# Altium footprint library 7-Connectors-8.PcbLib: 18 footprints (part 2 of 2)
Each footprint in its own frame and in the unit in brackets; x right, y up, seen from the top. Pads: shape width x height; smd on the part's side, far side on the other; paste and mask are expansions set on the pad; w line width, h text height; cw(c..) or ccw(c..) is an arc to the next point about the centre after c.
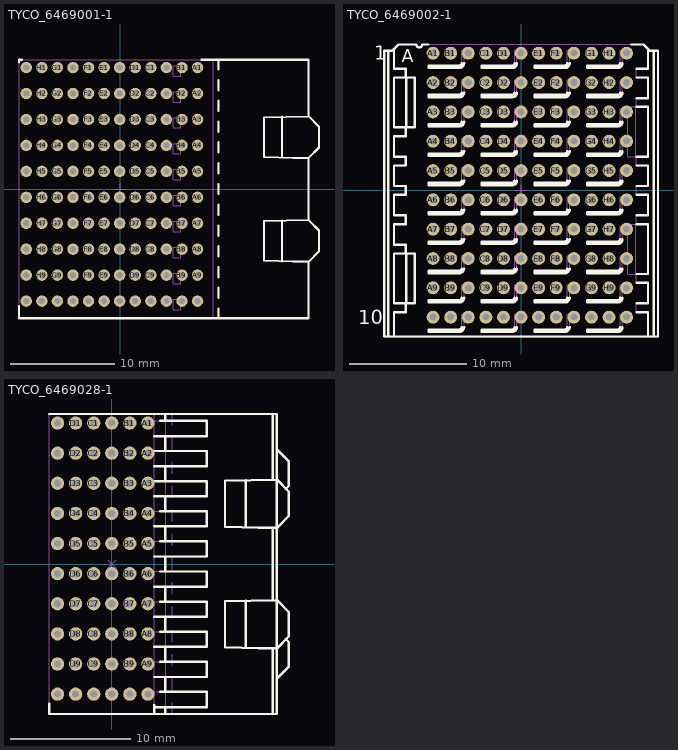
[diagram p1: the footprints below, top view; thin cyan lines are the x and y axes]

## TYCO_6469001-1 [mm] "80 Positions, Pitch 2.5mm,  Advanced TCA, Z-PACK HM-Zd Right Angle Press Fit Receptacle"
height 15.72
pads (120):
  round 1.1 hole 0.6: A1(7.435,11.7) A2(7.435,9.2) A3(7.435,6.7) A4(7.435,4.2) A5(7.435,1.7) A6(7.435,-0.8) A7(7.435,-3.3) A8(7.435,-5.8) A9(7.435,-8.3) A10(7.435,-10.8) B1(5.935,11.7) B2(5.935,9.2) B3(5.935,6.7) B4(5.935,4.2) B5(5.935,1.7) B6(5.935,-0.8) B7(5.935,-3.3) B8(5.935,-5.8) B9(5.935,-8.3) B10(5.935,-10.8) BG1(4.435,11.7) BG2(4.435,9.2) BG3(4.435,6.7) BG4(4.435,4.2) BG5(4.435,1.7) BG6(4.435,-0.8) BG7(4.435,-3.3) BG8(4.435,-5.8) BG9(4.435,-8.3) BG10(4.435,-10.8) C1(2.935,11.7) C2(2.935,9.2) C3(2.935,6.7) C4(2.935,4.2) C5(2.935,1.7) C6(2.935,-0.8) C7(2.935,-3.3) C8(2.935,-5.8) C9(2.935,-8.3) C10(2.935,-10.8) D1(1.435,11.7) D2(1.435,9.2) D3(1.435,6.7) D4(1.435,4.2) D5(1.435,1.7) D6(1.435,-0.8) D7(1.435,-3.3) D8(1.435,-5.8) D9(1.435,-8.3) D10(1.435,-10.8) DG1(-0.065,11.7) DG2(-0.065,9.2) DG3(-0.065,6.7) DG4(-0.065,4.2) DG5(-0.065,1.7) DG6(-0.065,-0.8) DG7(-0.065,-3.3) DG8(-0.065,-5.8) DG9(-0.065,-8.3) DG10(-0.065,-10.8) E1(-1.565,11.7) E2(-1.565,9.2) E3(-1.565,6.7) E4(-1.565,4.2) E5(-1.565,1.7) E6(-1.565,-0.8) E7(-1.565,-3.3) E8(-1.565,-5.8) E9(-1.565,-8.3) E10(-1.565,-10.8) F1(-3.065,11.7) F2(-3.065,9.2) F3(-3.065,6.7) F4(-3.065,4.2) F5(-3.065,1.7) F6(-3.065,-0.8) F7(-3.065,-3.3) F8(-3.065,-5.8) F9(-3.065,-8.3) F10(-3.065,-10.8) FG1(-4.565,11.7) FG2(-4.565,9.2) FG3(-4.565,6.7) FG4(-4.565,4.2) FG5(-4.565,1.7) FG6(-4.565,-0.8) FG7(-4.565,-3.3) FG8(-4.565,-5.8) FG9(-4.565,-8.3) FG10(-4.565,-10.8) G1(-6.065,11.7) G2(-6.065,9.2) G3(-6.065,6.7) G4(-6.065,4.2) G5(-6.065,1.7) G6(-6.065,-0.8) G7(-6.065,-3.3) G8(-6.065,-5.8) G9(-6.065,-8.3) G10(-6.065,-10.8) H1(-7.565,11.7) H2(-7.565,9.2) H3(-7.565,6.7) H4(-7.565,4.2) H5(-7.565,1.7) H6(-7.565,-0.8) H7(-7.565,-3.3) H8(-7.565,-5.8) H9(-7.565,-8.3) H10(-7.565,-10.8) HG1(-9.065,11.7) HG2(-9.065,9.2) HG3(-9.065,6.7) HG4(-9.065,4.2) HG5(-9.065,1.7) HG6(-9.065,-0.8) HG7(-9.065,-3.3) HG8(-9.065,-5.8) HG9(-9.065,-8.3) HG10(-9.065,-10.8)
Top Overlay:
  lines w0.2: -9.765,-11.282 -9.765,-12.45 18.135,-12.45 18.135,-7 ; -9.765,12.182 -9.765,12.45 -9.465,12.45 ; 7.835,12.45 18.135,12.45 18.135,7 ; 9.435,-12.45 9.435,-11.5 ; 9.435,-10.5 9.435,-9.5 ; 9.435,-8.5 9.435,-7.5 ; 9.435,-6.5 9.435,-5.5 ; 9.435,-4.5 9.435,-3.5 ; 9.435,-2.5 9.435,-1.5 ; 9.435,-0.5 9.435,0.5 ; 9.435,1.5 9.435,2.5 ; 9.435,3.5 9.435,4.5 ; 9.435,5.5 9.435,6.5 ; 9.435,7.5 9.435,8.5 ; 9.435,9.5 9.435,10.5 ; 9.435,11.5 9.435,12.45 ; 15.565,-6.963 15.565,-3.037 ; 15.565,3.037 15.565,6.963 ; 18.135,-7 16.635,-7 13.835,-6.903 13.835,-3.097 18.135,-3 ; 18.135,-7 19.135,-6 19.135,-4 18.135,-3 ; 18.135,-3 18.135,3 ; 18.135,3 16.635,3 13.835,3.097 13.835,6.903 18.135,7 ; 18.135,3 19.135,4 19.135,6 18.135,7
Mechanical 8:
  drawing of 486 lines, arcs and shapes, not listed
  text "PCB Edge" at 10.3,-3.5 h1
Mechanical 14:
  lines w0.1: 9.435,-12.45 9.435,-11.5 ; 9.435,-10.5 9.435,-9.5 ; 9.435,-8.5 9.435,-7.5 ; 9.435,-6.5 9.435,-5.5 ; 9.435,-4.5 9.435,-3.5 ; 9.435,-2.5 9.435,-1.5 ; 9.435,-0.5 9.435,0.5 ; 9.435,1.5 9.435,2.5 ; 9.435,3.5 9.435,4.5 ; 9.435,5.5 9.435,6.5 ; 9.435,7.5 9.435,8.5 ; 9.435,9.5 9.435,10.5 ; 9.435,11.5 9.435,12.45 ; 15.565,-6.963 15.565,-3.037 ; 15.565,3.037 15.565,6.963 ; 18.135,-7 16.635,-7 13.835,-6.903 13.835,-3.097 18.135,-3 ; 18.135,-7 19.135,-6 19.135,-4 18.135,-3 ; 18.135,-7 18.135,-12.45 -9.765,-12.45 -9.765,12.45 18.135,12.45 18.135,7 ; 18.135,-3 18.135,3 ; 18.135,3 16.635,3 13.835,3.097 13.835,6.903 18.135,7 ; 18.135,3 19.135,4 19.135,6 18.135,7 ; 5.115,-11.62 5.115,-10.62 5.835,-10.62 5.835,-11.62 5.115,-11.62 ; 5.115,-9.12 5.115,-8.12 5.835,-8.12 5.835,-9.12 5.115,-9.12 ; 5.115,-6.62 5.115,-5.62 5.835,-5.62 5.835,-6.62 5.115,-6.62 ; 5.115,-4.12 5.115,-3.12 5.835,-3.12 5.835,-4.12 5.115,-4.12 ; 5.115,-1.62 5.115,-0.62 5.835,-0.62 5.835,-1.62 5.115,-1.62 ; 5.115,0.88 5.115,1.88 5.835,1.88 5.835,0.88 5.115,0.88 ; 5.115,3.38 5.115,4.38 5.835,4.38 5.835,3.38 5.115,3.38 ; 5.115,5.88 5.115,6.88 5.835,6.88 5.835,5.88 5.115,5.88 ; 5.115,8.38 5.115,9.38 5.835,9.38 5.835,8.38 5.115,8.38 ; 5.115,10.88 5.115,11.88 5.835,11.88 5.835,10.88 5.115,10.88
Drill Drawing:
  lines w0.1: -9.75,-11.55 8.25,-11.55 8.25,12.45 -9.75,12.45 -9.75,-11.55
  text "diam. 0.6mm +0.06 -0" at 11.2,-9.3 h1
  text "PRESS-FIT TECHNOLOGY" at 9.7,-8.3 h1
3D body "TYCO_6469001-1.stp": height 16.67, standoff -4.68, extent -9.765,-12.45 19.135,12.45

## TYCO_6469002-1 [mm] "80 Positions, Pitch 2.5mm,  Advanced TCA, Z-PACK HM-Zd BackPlane Press Fit Header"
height 13.48
pads (120):
  round 1.1 hole 0.6: A1(-7.5,11.7) A2(-7.5,9.2) A3(-7.5,6.7) A4(-7.5,4.2) A5(-7.5,1.7) A6(-7.5,-0.8) A7(-7.5,-3.3) A8(-7.5,-5.8) A9(-7.5,-8.3) A10(-7.5,-10.8) B1(-6,11.7) B2(-6,9.2) B3(-6,6.7) B4(-6,4.2) B5(-6,1.7) B6(-6,-0.8) B7(-6,-3.3) B8(-6,-5.8) B9(-6,-8.3) B10(-6,-10.8) BG1(-4.5,11.7) BG2(-4.5,9.2) BG3(-4.5,6.7) BG4(-4.5,4.2) BG5(-4.5,1.7) BG6(-4.5,-0.8) BG7(-4.5,-3.3) BG8(-4.5,-5.8) BG9(-4.5,-8.3) BG10(-4.5,-10.8) C1(-3,11.7) C2(-3,9.2) C3(-3,6.7) C4(-3,4.2) C5(-3,1.7) C6(-3,-0.8) C7(-3,-3.3) C8(-3,-5.8) C9(-3,-8.3) C10(-3,-10.8) D1(-1.5,11.7) D2(-1.5,9.2) D3(-1.5,6.7) D4(-1.5,4.2) D5(-1.5,1.7) D6(-1.5,-0.8) D7(-1.5,-3.3) D8(-1.5,-5.8) D9(-1.5,-8.3) D10(-1.5,-10.8) DG1(0,11.7) DG2(0,9.2) DG3(0,6.7) DG4(0,4.2) DG5(0,1.7) DG6(0,-0.8) DG7(0,-3.3) DG8(0,-5.8) DG9(0,-8.3) DG10(0,-10.8) E1(1.5,11.7) E2(1.5,9.2) E3(1.5,6.7) E4(1.5,4.2) E5(1.5,1.7) E6(1.5,-0.8) E7(1.5,-3.3) E8(1.5,-5.8) E9(1.5,-8.3) E10(1.5,-10.8) F1(3,11.7) F2(3,9.2) F3(3,6.7) F4(3,4.2) F5(3,1.7) F6(3,-0.8) F7(3,-3.3) F8(3,-5.8) F9(3,-8.3) F10(3,-10.8) FG1(4.5,11.7) FG2(4.5,9.2) FG3(4.5,6.7) FG4(4.5,4.2) FG5(4.5,1.7) FG6(4.5,-0.8) FG7(4.5,-3.3) FG8(4.5,-5.8) FG9(4.5,-8.3) FG10(4.5,-10.8) G1(6,11.7) G2(6,9.2) G3(6,6.7) G4(6,4.2) G5(6,1.7) G6(6,-0.8) G7(6,-3.3) G8(6,-5.8) G9(6,-8.3) G10(6,-10.8) H1(7.5,11.7) H2(7.5,9.2) H3(7.5,6.7) H4(7.5,4.2) H5(7.5,1.7) H6(7.5,-0.8) H7(7.5,-3.3) H8(7.5,-5.8) H9(7.5,-8.3) H10(7.5,-10.8) HG1(9,11.7) HG2(9,9.2) HG3(9,6.7) HG4(9,4.2) HG5(9,1.7) HG6(9,-0.8) HG7(9,-3.3) HG8(9,-5.8) HG9(9,-8.3) HG10(9,-10.8)
Top Overlay:
  drawing of 268 lines, arcs and shapes, not listed
  text "10" at -13.9,-11.4 h1.2
  text "1" at -12.5,11.125 h1.2
  text "A" at -10.15,10.925 h1.1
Mechanical 8:
  drawing of 484 lines, arcs and shapes, not listed
Mechanical 14:
  drawing of 717 lines, arcs and shapes, not listed
Drill Drawing:
  lines w0.1: -8.25,-11.55 9.75,-11.55 9.75,12.45 -8.25,12.45 -8.25,-11.55
  text "diam. 0.6mm +0.06 -0" at 11.1,-9.2 h1
  text "PRESS-FIT TECHNOLOGY" at -8.8,-8.1 h1
3D body "TYCO_6469002-1.stp": height 13.4, standoff -2.5, extent -11.675,-12.45 11.675,12.45

## TYCO_6469028-1 [mm] "40 Positions, Pitch 2.5mm,  Advanced TCA, Z-PACK HM-Zd Right Angle Press Fit Receptacle"
height 8.58
pads (60):
  round 1.1 hole 0.6: A1(3,11.7) A2(3,9.2) A3(3,6.7) A4(3,4.2) A5(3,1.7) A6(3,-0.8) A7(3,-3.3) A8(3,-5.8) A9(3,-8.3) A10(3,-10.8) B1(1.5,11.7) B2(1.5,9.2) B3(1.5,6.7) B4(1.5,4.2) B5(1.5,1.7) B6(1.5,-0.8) B7(1.5,-3.3) B8(1.5,-5.8) B9(1.5,-8.3) B10(1.5,-10.8) BG1(0,11.7) BG2(0,9.2) BG3(0,6.7) BG4(0,4.2) BG5(0,1.7) BG6(0,-0.8) BG7(0,-3.3) BG8(0,-5.8) BG9(0,-8.3) BG10(0,-10.8) C1(-1.5,11.7) C2(-1.5,9.2) C3(-1.5,6.7) C4(-1.5,4.2) C5(-1.5,1.7) C6(-1.5,-0.8) C7(-1.5,-3.3) C8(-1.5,-5.8) C9(-1.5,-8.3) C10(-1.5,-10.8) D1(-3,11.7) D2(-3,9.2) D3(-3,6.7) D4(-3,4.2) D5(-3,1.7) D6(-3,-0.8) D7(-3,-3.3) D8(-3,-5.8) D9(-3,-8.3) D10(-3,-10.8) DG1(-4.5,11.7) DG2(-4.5,9.2) DG3(-4.5,6.7) DG4(-4.5,4.2) DG5(-4.5,1.7) DG6(-4.5,-0.8) DG7(-4.5,-3.3) DG8(-4.5,-5.8) DG9(-4.5,-8.3) DG10(-4.5,-10.8)
Top Overlay:
  lines w0.2: -5.2,-11.583 -5.2,-12.45 13.7,-12.45 13.7,12.45 -5.2,12.45 ; 3.54,-12.45 3.54,-11.701 ; 3.54,-11.88 7.9,-11.88 7.9,-10.62 4.034,-10.62 ; 3.54,-9.38 7.9,-9.38 7.9,-8.12 4.034,-8.12 ; 3.54,-6.88 7.9,-6.88 7.9,-5.62 4.034,-5.62 ; 3.54,-4.38 7.9,-4.38 7.9,-3.12 4.034,-3.12 ; 3.54,-1.88 7.9,-1.88 7.9,-0.62 4.034,-0.62 ; 3.54,0.62 7.9,0.62 7.9,1.88 4.034,1.88 ; 3.54,3.12 7.9,3.12 7.9,4.38 4.034,4.38 ; 3.54,5.62 7.9,5.62 7.9,6.88 3.54,6.88 ; 3.54,8.12 7.9,8.12 7.9,9.38 3.54,9.38 ; 3.54,10.62 7.9,10.62 7.9,11.88 4.034,11.88 ; 4.45,-12.45 4.45,-11.88 ; 4.45,-10.62 4.45,-9.38 ; 4.45,-8.12 4.45,-6.88 ; 4.45,-5.62 4.45,-4.38 ; 4.45,-3.12 4.45,-1.88 ; 4.45,-0.62 4.45,0.62 ; 4.45,1.88 4.45,3.12 ; 4.45,4.38 4.45,5.62 ; 4.45,6.88 4.45,8.12 ; 4.45,9.38 4.45,10.62 ; 4.45,11.88 4.45,12.45 ; 11.13,-6.963 11.13,-3.037 ; 11.13,3.037 11.13,6.963 ; 13.35,-12.45 13.35,-7 ; 13.35,-3 13.35,3 ; 13.35,7 13.35,12.45 ; 13.7,-9.5 14.7,-8.5 14.7,-6.5 14.45,-6.25 ; 13.7,9.5 14.7,8.5 14.7,6.5 14.45,6.25 ; 9.4,-6.903 12.2,-7 13.7,-7 14.7,-6 14.7,-4 13.7,-3 9.4,-3.097 9.4,-6.903 ; 9.4,3.097 12.2,3 13.7,3 14.7,4 14.7,6 13.7,7 9.4,6.903 9.4,3.097
Mechanical 8:
  drawing of 246 lines, arcs and shapes, not listed
  text "PCB Edge" at 5.865,-3.5 h1
Mechanical 14:
  lines w0.1: 3.54,-12.45 3.54,12.45 ; 3.54,-11.88 7.9,-11.88 7.9,-10.62 3.54,-10.62 ; 3.54,-9.38 7.9,-9.38 7.9,-8.12 3.54,-8.12 ; 3.54,-6.88 7.9,-6.88 7.9,-5.62 3.54,-5.62 ; 3.54,-4.38 7.9,-4.38 7.9,-3.12 3.54,-3.12 ; 3.54,-1.88 7.9,-1.88 7.9,-0.62 3.54,-0.62 ; 3.54,0.62 7.9,0.62 7.9,1.88 3.54,1.88 ; 3.54,3.12 7.9,3.12 7.9,4.38 3.54,4.38 ; 3.54,5.62 7.9,5.62 7.9,6.88 3.54,6.88 ; 3.54,8.12 7.9,8.12 7.9,9.38 3.54,9.38 ; 3.54,10.62 7.9,10.62 7.9,11.88 3.54,11.88 ; 4.45,-12.45 4.45,-11.88 ; 4.45,-10.62 4.45,-9.38 ; 4.45,-8.12 4.45,-6.88 ; 4.45,-5.62 4.45,-4.38 ; 4.45,-3.12 4.45,-1.88 ; 4.45,-0.62 4.45,0.62 ; 4.45,1.88 4.45,3.12 ; 4.45,4.38 4.45,5.62 ; 4.45,6.88 4.45,8.12 ; 4.45,9.38 4.45,10.62 ; 4.45,11.88 4.45,12.45 ; 5,-12.45 5,-11.5 ; 5,-10.5 5,-9.5 ; 5,-8.5 5,-7.5 ; 5,-6.5 5,-5.5 ; 5,-4.5 5,-3.5 ; 5,-2.5 5,-1.5 ; 5,-0.5 5,0.5 ; 5,1.5 5,2.5 ; 5,3.5 5,4.5 ; 5,5.5 5,6.5 ; 5,7.5 5,8.5 ; 5,9.5 5,10.5 ; 5,11.5 5,12.45 ; 11.13,-6.963 11.13,-3.037 ; 11.13,3.037 11.13,6.963 ; 13.35,-12.45 13.35,-7 ; 13.35,-3 13.35,3 ; 13.35,7 13.35,12.45 ; 13.7,-9.5 14.7,-8.5 14.7,-6.5 14.45,-6.25 ; 13.7,9.5 14.7,8.5 14.7,6.5 14.45,6.25 ; -5.2,-12.45 -5.2,12.45 13.7,12.45 13.7,-12.45 -5.2,-12.45 ; 9.4,-6.903 12.2,-7 13.7,-7 14.7,-6 14.7,-4 13.7,-3 9.4,-3.097 9.4,-6.903 ; 9.4,3.097 12.2,3 13.7,3 14.7,4 14.7,6 13.7,7 9.4,6.903 9.4,3.097
Drill Drawing:
  lines w0.1: -5.2,-12.45 3.775,-12.45 3.775,12.45 -5.2,12.45 -5.2,-12.45
  text "diam. 0.6mm +0.06 -0" at 6.765,-9.3 h1
  text "PRESS-FIT TECHNOLOGY" at 5.265,-8.3 h1
3D body "TYCO_6469028-1.stp": height 8.67, standoff -4.68, extent -5.2,-12.45 14.7,12.45